# Altium footprint library Sockets.PcbLib: 80 footprints (part 3 of 6) (continued)
## DIPS28-600_a [mm] "DIP Socket 28 Leads, Row Spacing 15.24mm; Pitch 2.54mm" (continued)
3D body "DIPS28-600.stp": height 4.2, standoff -3.17, extent -8.85,-17.78 8.85,17.78

## DIPS32-600 [mm] "DIP Socket 32 Leads, Row Spacing 15.24mm; Pitch 2.54mm"
height 4.2
pads (32):
  rect 1.5x1.5 hole 0.9: 1(-7.62,19.05)
  round 1.5 hole 0.9: 2(-7.62,16.51) 3(-7.62,13.97) 4(-7.62,11.43) 5(-7.62,8.89) 6(-7.62,6.35) 7(-7.62,3.81) 8(-7.62,1.27) 9(-7.62,-1.27) 10(-7.62,-3.81) 11(-7.62,-6.35) 12(-7.62,-8.89) 13(-7.62,-11.43) 14(-7.62,-13.97) 15(-7.62,-16.51) 16(-7.62,-19.05) 17(7.62,-19.05) 18(7.62,-16.51) 19(7.62,-13.97) 20(7.62,-11.43) 21(7.62,-8.89) 22(7.62,-6.35) 23(7.62,-3.81) 24(7.62,-1.27) 25(7.62,1.27) 26(7.62,3.81) 27(7.62,6.35) 28(7.62,8.89) 29(7.62,11.43) 30(7.62,13.97) 31(7.62,16.51) 32(7.62,19.05)
Top Overlay:
  lines w0.2: -5.14,-1.45 5.36,-1.45 ; -5.14,1.45 5.36,1.45 ; -5.14,17.42 5.36,17.42 ; -5.14,20.32 -5.14,-17.42 5.36,-17.42 5.36,20.32 ; -8.85,-20.32 8.85,-20.32 8.85,20.32 -1.23,20.32 cw(c-2.43,20.32) -3.63,20.32 -8.85,20.32 -8.85,-20.32
Mechanical 8:
  lines w0.1: -8.12,-19.05 -7.62,-19.05 ; -8.12,-16.51 -7.62,-16.51 ; -8.12,-8.89 -7.62,-8.89 ; -8.12,-6.35 -7.62,-6.35 ; -8.12,-3.81 -7.62,-3.81 ; -8.12,-1.27 -7.62,-1.27 ; -8.12,1.27 -7.62,1.27 ; -8.12,3.81 -7.62,3.81 ; -8.12,6.35 -7.62,6.35 ; -8.12,8.89 -7.62,8.89 ; -8.12,11.43 -7.62,11.43 ; -8.12,13.97 -7.62,13.97 ; -8.12,16.51 -7.62,16.51 ; -8.12,19.05 -7.62,19.05 ; -7.62,-19.55 -7.62,-19.05 ; -7.62,-18.55 -7.62,-19.05 ; -7.62,-17.01 -7.62,-16.51 ; -7.62,-16.01 -7.62,-16.51 ; -7.62,-9.39 -7.62,-8.89 ; -7.62,-8.39 -7.62,-8.89 ; -7.62,-6.85 -7.62,-6.35 ; -7.62,-5.85 -7.62,-6.35 ; -7.62,-4.31 -7.62,-3.81 ; -7.62,-3.31 -7.62,-3.81 ; -7.62,-1.77 -7.62,-1.27 ; -7.62,-0.77 -7.62,-1.27 ; -7.62,0.77 -7.62,1.27 ; -7.62,1.77 -7.62,1.27 ; -7.62,3.31 -7.62,3.81 ; -7.62,4.31 -7.62,3.81 ; -7.62,5.85 -7.62,6.35 ; -7.62,6.85 -7.62,6.35 ; -7.62,8.39 -7.62,8.89 ; -7.62,9.39 -7.62,8.89 ; -7.62,10.93 -7.62,11.43 ; -7.62,11.93 -7.62,11.43 ; -7.62,13.47 -7.62,13.97 ; -7.62,14.47 -7.62,13.97 ; -7.62,16.01 -7.62,16.51 ; -7.62,17.01 -7.62,16.51 ; -7.62,18.55 -7.62,19.05 ; -7.62,19.55 -7.62,19.05 ; -7.12,-19.05 -7.62,-19.05 ; -7.12,-16.51 -7.62,-16.51 ; -7.12,-8.89 -7.62,-8.89 ; -7.12,-6.35 -7.62,-6.35 ; -7.12,-3.81 -7.62,-3.81 ; -7.12,-1.27 -7.62,-1.27 ; -7.12,1.27 -7.62,1.27 ; -7.12,3.81 -7.62,3.81 ; -7.12,6.35 -7.62,6.35 ; -7.12,8.89 -7.62,8.89 ; -7.12,11.43 -7.62,11.43 ; -7.12,13.97 -7.62,13.97 ; -7.12,16.51 -7.62,16.51 ; -7.12,19.05 -7.62,19.05 ; -0.5,0 0,0 ; 0,-0.5 0,0 ; 0,0.5 0,0 ; 0.5,0 0,0 ; 7.12,-19.05 7.62,-19.05 ; 7.12,-16.51 7.62,-16.51 ; 7.12,-13.97 7.62,-13.97 ; 7.12,-11.43 7.62,-11.43 ; 7.12,-8.89 7.62,-8.89 ; 7.12,-6.35 7.62,-6.35 ; 7.12,-3.81 7.62,-3.81 ; 7.12,-1.27 7.62,-1.27 ; 7.12,1.27 7.62,1.27 ; 7.12,3.81 7.62,3.81 ; 7.12,6.35 7.62,6.35 ; 7.12,8.89 7.62,8.89 ; 7.12,11.43 7.62,11.43 ; 7.12,13.97 7.62,13.97 ; 7.12,16.51 7.62,16.51 ; 7.12,19.05 7.62,19.05 ; 7.62,-19.55 7.62,-19.05 ; 7.62,-18.55 7.62,-19.05 ; 7.62,-17.01 7.62,-16.51 ; 7.62,-16.01 7.62,-16.51 ; 7.62,-14.47 7.62,-13.97 ; 7.62,-13.47 7.62,-13.97 ; 7.62,-11.93 7.62,-11.43 ; 7.62,-10.93 7.62,-11.43 ; 7.62,-9.39 7.62,-8.89 ; 7.62,-8.39 7.62,-8.89 ; 7.62,-6.85 7.62,-6.35 ; 7.62,-5.85 7.62,-6.35 ; 7.62,-4.31 7.62,-3.81 ; 7.62,-3.31 7.62,-3.81 ; 7.62,-1.77 7.62,-1.27 ; 7.62,-0.77 7.62,-1.27 ; 7.62,0.77 7.62,1.27 ; 7.62,1.77 7.62,1.27 ; 7.62,3.31 7.62,3.81 ; 7.62,4.31 7.62,3.81 ; 7.62,5.85 7.62,6.35 ; 7.62,6.85 7.62,6.35 ; 7.62,8.39 7.62,8.89 ; 7.62,9.39 7.62,8.89 ; 7.62,10.93 7.62,11.43 ; 7.62,11.93 7.62,11.43 ; 7.62,13.47 7.62,13.97 ; 7.62,14.47 7.62,13.97 ; 7.62,16.01 7.62,16.51 ; 7.62,17.01 7.62,16.51 ; 7.62,18.55 7.62,19.05 ; 7.62,19.55 7.62,19.05 ; 8.12,-19.05 7.62,-19.05 ; 8.12,-16.51 7.62,-16.51 ; 8.12,-13.97 7.62,-13.97 ; 8.12,-11.43 7.62,-11.43 ; 8.12,-8.89 7.62,-8.89 ; 8.12,-6.35 7.62,-6.35 ; 8.12,-3.81 7.62,-3.81 ; 8.12,-1.27 7.62,-1.27 ; 8.12,1.27 7.62,1.27 ; 8.12,3.81 7.62,3.81 ; 8.12,6.35 7.62,6.35 ; 8.12,8.89 7.62,8.89 ; 8.12,11.43 7.62,11.43 ; 8.12,13.97 7.62,13.97 ; 8.12,16.51 7.62,16.51 ; 8.12,19.05 7.62,19.05
Mechanical 14:
  lines w0.1: -5.14,-1.45 5.36,-1.45 ; -5.14,1.45 5.36,1.45 ; -5.14,17.42 5.36,17.42 ; -5.14,20.32 -5.14,-17.42 5.36,-17.42 5.36,20.32 ; -8.85,-20.32 8.85,-20.32 8.85,20.32 -1.23,20.32 cw(c-2.43,20.32) -3.63,20.32 -8.85,20.32 -8.85,-20.32
3D body "DIPS32-600.stp": height 4.2, standoff -3.17, extent -8.85,-20.32 8.85,20.32

## DIPS32-600_a [mm] "DIP Socket 32 Leads, Row Spacing 15.24mm; Pitch 2.54mm"
height 4.2
Top Overlay:
  lines w0.2: -5.14,-1.45 5.36,-1.45 ; -5.14,1.45 5.36,1.45 ; -5.14,17.42 5.36,17.42 ; -5.14,20.32 -5.14,-17.42 5.36,-17.42 5.36,20.32 ; -8.85,-20.32 8.85,-20.32 8.85,20.32 -1.23,20.32 cw(c-2.43,20.32) -3.63,20.32 -8.85,20.32 -8.85,-20.32
Mechanical 8:
  lines w0.1: -8.12,-19.05 -7.62,-19.05 ; -8.12,-16.51 -7.62,-16.51 ; -8.12,-8.89 -7.62,-8.89 ; -8.12,-6.35 -7.62,-6.35 ; -8.12,-3.81 -7.62,-3.81 ; -8.12,-1.27 -7.62,-1.27 ; -8.12,1.27 -7.62,1.27 ; -8.12,3.81 -7.62,3.81 ; -8.12,6.35 -7.62,6.35 ; -8.12,8.89 -7.62,8.89 ; -8.12,11.43 -7.62,11.43 ; -8.12,13.97 -7.62,13.97 ; -8.12,16.51 -7.62,16.51 ; -8.12,19.05 -7.62,19.05 ; -7.62,-19.55 -7.62,-19.05 ; -7.62,-18.55 -7.62,-19.05 ; -7.62,-17.01 -7.62,-16.51 ; -7.62,-16.01 -7.62,-16.51 ; -7.62,-9.39 -7.62,-8.89 ; -7.62,-8.39 -7.62,-8.89 ; -7.62,-6.85 -7.62,-6.35 ; -7.62,-5.85 -7.62,-6.35 ; -7.62,-4.31 -7.62,-3.81 ; -7.62,-3.31 -7.62,-3.81 ; -7.62,-1.77 -7.62,-1.27 ; -7.62,-0.77 -7.62,-1.27 ; -7.62,0.77 -7.62,1.27 ; -7.62,1.77 -7.62,1.27 ; -7.62,3.31 -7.62,3.81 ; -7.62,4.31 -7.62,3.81 ; -7.62,5.85 -7.62,6.35 ; -7.62,6.85 -7.62,6.35 ; -7.62,8.39 -7.62,8.89 ; -7.62,9.39 -7.62,8.89 ; -7.62,10.93 -7.62,11.43 ; -7.62,11.93 -7.62,11.43 ; -7.62,13.47 -7.62,13.97 ; -7.62,14.47 -7.62,13.97 ; -7.62,16.01 -7.62,16.51 ; -7.62,17.01 -7.62,16.51 ; -7.62,18.55 -7.62,19.05 ; -7.62,19.55 -7.62,19.05 ; -7.12,-19.05 -7.62,-19.05 ; -7.12,-16.51 -7.62,-16.51 ; -7.12,-8.89 -7.62,-8.89 ; -7.12,-6.35 -7.62,-6.35 ; -7.12,-3.81 -7.62,-3.81 ; -7.12,-1.27 -7.62,-1.27 ; -7.12,1.27 -7.62,1.27 ; -7.12,3.81 -7.62,3.81 ; -7.12,6.35 -7.62,6.35 ; -7.12,8.89 -7.62,8.89 ; -7.12,11.43 -7.62,11.43 ; -7.12,13.97 -7.62,13.97 ; -7.12,16.51 -7.62,16.51 ; -7.12,19.05 -7.62,19.05 ; -0.5,0 0,0 ; 0,-0.5 0,0 ; 0,0.5 0,0 ; 0.5,0 0,0 ; 7.12,-19.05 7.62,-19.05 ; 7.12,-16.51 7.62,-16.51 ; 7.12,-13.97 7.62,-13.97 ; 7.12,-11.43 7.62,-11.43 ; 7.12,-8.89 7.62,-8.89 ; 7.12,-6.35 7.62,-6.35 ; 7.12,-3.81 7.62,-3.81 ; 7.12,-1.27 7.62,-1.27 ; 7.12,1.27 7.62,1.27 ; 7.12,3.81 7.62,3.81 ; 7.12,6.35 7.62,6.35 ; 7.12,8.89 7.62,8.89 ; 7.12,11.43 7.62,11.43 ; 7.12,13.97 7.62,13.97 ; 7.12,16.51 7.62,16.51 ; 7.12,19.05 7.62,19.05 ; 7.62,-19.55 7.62,-19.05 ; 7.62,-18.55 7.62,-19.05 ; 7.62,-17.01 7.62,-16.51 ; 7.62,-16.01 7.62,-16.51 ; 7.62,-14.47 7.62,-13.97 ; 7.62,-13.47 7.62,-13.97 ; 7.62,-11.93 7.62,-11.43 ; 7.62,-10.93 7.62,-11.43 ; 7.62,-9.39 7.62,-8.89 ; 7.62,-8.39 7.62,-8.89 ; 7.62,-6.85 7.62,-6.35 ; 7.62,-5.85 7.62,-6.35 ; 7.62,-4.31 7.62,-3.81 ; 7.62,-3.31 7.62,-3.81 ; 7.62,-1.77 7.62,-1.27 ; 7.62,-0.77 7.62,-1.27 ; 7.62,0.77 7.62,1.27 ; 7.62,1.77 7.62,1.27 ; 7.62,3.31 7.62,3.81 ; 7.62,4.31 7.62,3.81 ; 7.62,5.85 7.62,6.35 ; 7.62,6.85 7.62,6.35 ; 7.62,8.39 7.62,8.89 ; 7.62,9.39 7.62,8.89 ; 7.62,10.93 7.62,11.43 ; 7.62,11.93 7.62,11.43 ; 7.62,13.47 7.62,13.97 ; 7.62,14.47 7.62,13.97 ; 7.62,16.01 7.62,16.51 ; 7.62,17.01 7.62,16.51 ; 7.62,18.55 7.62,19.05 ; 7.62,19.55 7.62,19.05 ; 8.12,-19.05 7.62,-19.05 ; 8.12,-16.51 7.62,-16.51 ; 8.12,-13.97 7.62,-13.97 ; 8.12,-11.43 7.62,-11.43 ; 8.12,-8.89 7.62,-8.89 ; 8.12,-6.35 7.62,-6.35 ; 8.12,-3.81 7.62,-3.81 ; 8.12,-1.27 7.62,-1.27 ; 8.12,1.27 7.62,1.27 ; 8.12,3.81 7.62,3.81 ; 8.12,6.35 7.62,6.35 ; 8.12,8.89 7.62,8.89 ; 8.12,11.43 7.62,11.43 ; 8.12,13.97 7.62,13.97 ; 8.12,16.51 7.62,16.51 ; 8.12,19.05 7.62,19.05
Mechanical 14:
  lines w0.1: -5.14,-1.45 5.36,-1.45 ; -5.14,1.45 5.36,1.45 ; -5.14,17.42 5.36,17.42 ; -5.14,20.32 -5.14,-17.42 5.36,-17.42 5.36,20.32 ; -8.85,-20.32 8.85,-20.32 8.85,20.32 -1.23,20.32 cw(c-2.43,20.32) -3.63,20.32 -8.85,20.32 -8.85,-20.32
3D body "DIPS32-600.stp": height 4.2, standoff -3.17, extent -8.85,-20.32 8.85,20.32

## DIPS40-600 [mm] "DIP Socket 40 Leads, Row Spacing 15.24mm; Pitch 2.54mm"
height 4.2
pads (40):
  rect 1.5x1.5 hole 0.9: 1(-7.62,24.13)
  round 1.5 hole 0.9: 2(-7.62,21.59) 3(-7.62,19.05) 4(-7.62,16.51) 5(-7.62,13.97) 6(-7.62,11.43) 7(-7.62,8.89) 8(-7.62,6.35) 9(-7.62,3.81) 10(-7.62,1.27) 11(-7.62,-1.27) 12(-7.62,-3.81) 13(-7.62,-6.35) 14(-7.62,-8.89) 15(-7.62,-11.43) 16(-7.62,-13.97) 17(-7.62,-16.51) 18(-7.62,-19.05) 19(-7.62,-21.59) 20(-7.62,-24.13) 21(7.62,-24.13) 22(7.62,-21.59) 23(7.62,-19.05) 24(7.62,-16.51) 25(7.62,-13.97) 26(7.62,-11.43) 27(7.62,-8.89) 28(7.62,-6.35) 29(7.62,-3.81) 30(7.62,-1.27) 31(7.62,1.27) 32(7.62,3.81) 33(7.62,6.35) 34(7.62,8.89) 35(7.62,11.43) 36(7.62,13.97) 37(7.62,16.51) 38(7.62,19.05) 39(7.62,21.59) 40(7.62,24.13)
Top Overlay:
  lines w0.2: -5.14,-25.4 -5.14,25.4 ; -5.14,-22.5 5.36,-22.5 ; -5.14,-9.07 5.36,-9.07 ; -5.14,-6.17 5.36,-6.17 ; -5.14,7.26 5.36,7.26 ; -5.14,10.16 5.36,10.16 ; -5.14,22.5 5.36,22.5 ; 5.36,-25.4 5.36,25.4 ; -8.85,-25.4 -8.85,25.4 -3.85,25.4 ccw(c-2.65,25.4) -1.45,25.4 8.85,25.4 8.85,-25.4 -8.85,-25.4
Mechanical 8:
  drawing of 164 lines, arcs and shapes, not listed
Mechanical 14:
  lines w0.1: -5.14,-25.4 -5.14,25.4 ; -5.14,-22.5 5.36,-22.5 ; -5.14,-9.07 5.36,-9.07 ; -5.14,-6.17 5.36,-6.17 ; -5.14,7.26 5.36,7.26 ; -5.14,10.16 5.36,10.16 ; -5.14,22.5 5.36,22.5 ; 5.36,-25.4 5.36,25.4 ; -8.85,-25.4 -8.85,25.4 -3.85,25.4 ccw(c-2.65,25.4) -1.45,25.4 8.85,25.4 8.85,-25.4 -8.85,-25.4
3D body "DIPS40-600.stp": height 4.2, standoff -3.17, extent -8.85,-25.4 8.85,25.4

## DIPS40-600_a [mm] "DIP Socket 40 Leads, Row Spacing 15.24mm; Pitch 2.54mm"
height 4.2
Top Overlay:
  lines w0.2: -5.14,-25.4 -5.14,25.4 ; -5.14,-22.5 5.36,-22.5 ; -5.14,-9.07 5.36,-9.07 ; -5.14,-6.17 5.36,-6.17 ; -5.14,7.26 5.36,7.26 ; -5.14,10.16 5.36,10.16 ; -5.14,22.5 5.36,22.5 ; 5.36,-25.4 5.36,25.4 ; -8.85,-25.4 -8.85,25.4 -3.85,25.4 ccw(c-2.65,25.4) -1.45,25.4 8.85,25.4 8.85,-25.4 -8.85,-25.4
Mechanical 8:
  drawing of 164 lines, arcs and shapes, not listed
Mechanical 14:
  lines w0.1: -5.14,-25.4 -5.14,25.4 ; -5.14,-22.5 5.36,-22.5 ; -5.14,-9.07 5.36,-9.07 ; -5.14,-6.17 5.36,-6.17 ; -5.14,7.26 5.36,7.26 ; -5.14,10.16 5.36,10.16 ; -5.14,22.5 5.36,22.5 ; 5.36,-25.4 5.36,25.4 ; -8.85,-25.4 -8.85,25.4 -3.85,25.4 ccw(c-2.65,25.4) -1.45,25.4 8.85,25.4 8.85,-25.4 -8.85,-25.4
3D body "DIPS40-600.stp": height 4.2, standoff -3.17, extent -8.85,-25.4 8.85,25.4

## DONGXIN_GZC9-Y [mm] "9 Pin Ceramic PCB Tube Socket"
height 17.8
pads (9):
  rrect50% 2.5x2.5 hole 1.8 rot 36: 1(-5.878,8.09)
  round 2.5 hole 1.8: 2(-9.511,3.09) 3(-9.511,-3.09) 4(-5.878,-8.09) 5(0,-10) 6(5.878,-8.09) 7(9.511,-3.09) 8(9.511,3.09) 9(5.878,8.09)
Top Overlay:
  circle w0.2: c0,0 r3.55
  circle w0.2: c0,0 r3.15
  circle w0.2: c-3.527,-4.854 r0.65
  circle w0.2: c0,-6 r0.65
  circle w0.2: c3.527,-4.854 r0.65
  circle w0.2: c5.706,-1.854 r0.65
  circle w0.2: c5.706,1.854 r0.65
  circle w0.2: c-3.527,4.854 r0.65
  circle w0.2: c-5.706,1.854 r0.65
  circle w0.2: c-5.706,-1.854 r0.65
  circle w0.2: c3.527,4.854 r0.65
  circle w0.2: c0,0 r7.009
  circle w0.2: c0,0 r4.992
  circle w0.2: c0,0 r3.55
  circle w0.2: c0,0 r3.15
  lines w0.2: -12.133,-3.399 ccw(c-15.8,0) -12.133,3.399 cw(c0,0) 12.133,3.399 ccw(c15.8,0) 12.133,-3.399 cw(c0,0) -12.133,-3.399
Mechanical 8:
  lines w0.1: -9.986,-3.245 -9.511,-3.09 ; -9.986,3.245 -9.511,3.09 ; -9.665,-2.615 -9.511,-3.09 ; -9.665,2.615 -9.511,3.09 ; -9.356,-3.566 -9.511,-3.09 ; -9.356,3.566 -9.511,3.09 ; -9.035,-2.936 -9.511,-3.09 ; -9.035,2.936 -9.511,3.09 ; -6.282,-7.796 -5.878,-8.09 ; -6.282,7.796 -5.878,8.09 ; -6.172,-8.495 -5.878,-8.09 ; -6.172,8.495 -5.878,8.09 ; -5.584,-7.686 -5.878,-8.09 ; -5.584,7.686 -5.878,8.09 ; -5.473,-8.384 -5.878,-8.09 ; -5.473,8.384 -5.878,8.09 ; 5.473,-8.384 5.878,-8.09 ; 5.473,8.384 5.878,8.09 ; 5.584,-7.686 5.878,-8.09 ; 5.584,7.686 5.878,8.09 ; 6.172,-8.495 5.878,-8.09 ; 6.172,8.495 5.878,8.09 ; 6.282,-7.796 5.878,-8.09 ; 6.282,7.796 5.878,8.09 ; 9.035,-2.936 9.511,-3.09 ; 9.035,2.936 9.511,3.09 ; 9.356,-3.566 9.511,-3.09 ; 9.356,3.566 9.511,3.09 ; 9.665,-2.615 9.511,-3.09 ; 9.665,2.615 9.511,3.09 ; 9.986,-3.245 9.511,-3.09 ; 9.986,3.245 9.511,3.09 ; 0,-10 0,-9.5 0,-10 ; 0,-10 0.5,-10 0,-10 ; 0,-10 0,-10.5 0,-10 ; 0,-10 -0.5,-10 0,-10 ; 0,0 0,0.5 0,0 ; 0,0 0.5,0 0,0 ; 0,0 0,-0.5 0,0 ; 0,0 -0.5,0 0,0
Mechanical 14:
  circle w0.1: c0,0 r10.4
  circle w0.1: c0,0 r10.8
  lines w0.1: -12.133,-3.399 ccw(c-15.8,0) -12.133,3.399 cw(c0,0) 12.133,3.399 ccw(c15.8,0) 12.133,-3.399 cw(c0,0) -12.133,-3.399
3D body "DONGXIN_GZC9-Y.stp": height 14, standoff -3.8, extent -12.133,-12.6 12.133,12.6

## E-TEC_BPQ400-0830-20AA95 [mm] "400 Pins, Pitch 0.8mm, Matrix 20x20, BGA Quick Lock Socket"
height 24.2
pads (402):
  round 0.5 hole 1.1 unplated: 1(-15.6,4) 2(15.6,-4)
  round 0.4 smd: A1(-7.6,7.6) A2(-6.8,7.6) A3(-6,7.6) A4(-5.2,7.6) A5(-4.4,7.6) A6(-3.6,7.6) A7(-2.8,7.6) A8(-2,7.6) A9(-1.2,7.6) A10(-0.4,7.6) A11(0.4,7.6) A12(1.2,7.6) A13(2,7.6) A14(2.8,7.6) A15(3.6,7.6) A16(4.4,7.6) A17(5.2,7.6) A18(6,7.6) A19(6.8,7.6) A20(7.6,7.6) B1(-7.6,6.8) B2(-6.8,6.8) B3(-6,6.8) B4(-5.2,6.8) B5(-4.4,6.8) B6(-3.6,6.8) B7(-2.8,6.8) B8(-2,6.8) B9(-1.2,6.8) B10(-0.4,6.8) B11(0.4,6.8) B12(1.2,6.8) B13(2,6.8) B14(2.8,6.8) B15(3.6,6.8) B16(4.4,6.8) B17(5.2,6.8) B18(6,6.8) B19(6.8,6.8) B20(7.6,6.8) C1(-7.6,6) C2(-6.8,6) C3(-6,6) C4(-5.2,6) C5(-4.4,6) C6(-3.6,6) C7(-2.8,6) C8(-2,6) C9(-1.2,6) C10(-0.4,6) C11(0.4,6) C12(1.2,6) C13(2,6) C14(2.8,6) C15(3.6,6) C16(4.4,6) C17(5.2,6) C18(6,6) C19(6.8,6) C20(7.6,6) D1(-7.6,5.2) D2(-6.8,5.2) D3(-6,5.2) D4(-5.2,5.2) D5(-4.4,5.2) D6(-3.6,5.2) D7(-2.8,5.2) D8(-2,5.2) D9(-1.2,5.2) D10(-0.4,5.2) D11(0.4,5.2) D12(1.2,5.2) D13(2,5.2) D14(2.8,5.2) D15(3.6,5.2) D16(4.4,5.2) D17(5.2,5.2) D18(6,5.2) D19(6.8,5.2) D20(7.6,5.2) E1(-7.6,4.4) E2(-6.8,4.4) E3(-6,4.4) E4(-5.2,4.4) E5(-4.4,4.4) E6(-3.6,4.4) E7(-2.8,4.4) E8(-2,4.4) E9(-1.2,4.4) E10(-0.4,4.4) E11(0.4,4.4) E12(1.2,4.4) E13(2,4.4) E14(2.8,4.4) E15(3.6,4.4) E16(4.4,4.4) E17(5.2,4.4) E18(6,4.4) E19(6.8,4.4) E20(7.6,4.4) F1(-7.6,3.6) F2(-6.8,3.6) F3(-6,3.6) F4(-5.2,3.6) F5(-4.4,3.6) F6(-3.6,3.6) F7(-2.8,3.6) F8(-2,3.6) F9(-1.2,3.6) F10(-0.4,3.6) F11(0.4,3.6) F12(1.2,3.6) F13(2,3.6) F14(2.8,3.6) F15(3.6,3.6) F16(4.4,3.6) F17(5.2,3.6) F18(6,3.6) F19(6.8,3.6) F20(7.6,3.6) G1(-7.6,2.8) G2(-6.8,2.8) G3(-6,2.8) G4(-5.2,2.8) G5(-4.4,2.8) G6(-3.6,2.8) G7(-2.8,2.8) G8(-2,2.8) G9(-1.2,2.8) G10(-0.4,2.8) G11(0.4,2.8) G12(1.2,2.8) G13(2,2.8) G14(2.8,2.8) G15(3.6,2.8) G16(4.4,2.8) G17(5.2,2.8) G18(6,2.8) G19(6.8,2.8) G20(7.6,2.8) H1(-7.6,2) H2(-6.8,2) H3(-6,2) H4(-5.2,2) H5(-4.4,2) H6(-3.6,2) H7(-2.8,2) H8(-2,2) H9(-1.2,2) H10(-0.4,2) H11(0.4,2) H12(1.2,2) H13(2,2) H14(2.8,2) H15(3.6,2) H16(4.4,2) H17(5.2,2) H18(6,2) H19(6.8,2) H20(7.6,2) J1(-7.6,1.2) J2(-6.8,1.2) J3(-6,1.2) J4(-5.2,1.2) J5(-4.4,1.2) J6(-3.6,1.2) J7(-2.8,1.2) J8(-2,1.2) J9(-1.2,1.2) J10(-0.4,1.2) J11(0.4,1.2) J12(1.2,1.2) J13(2,1.2) J14(2.8,1.2) J15(3.6,1.2) J16(4.4,1.2) J17(5.2,1.2) J18(6,1.2) J19(6.8,1.2) J20(7.6,1.2) K1(-7.6,0.4) K2(-6.8,0.4) K3(-6,0.4) K4(-5.2,0.4) K5(-4.4,0.4) K6(-3.6,0.4) K7(-2.8,0.4) K8(-2,0.4) K9(-1.2,0.4) K10(-0.4,0.4) K11(0.4,0.4) K12(1.2,0.4) K13(2,0.4) K14(2.8,0.4) K15(3.6,0.4) K16(4.4,0.4) K17(5.2,0.4) K18(6,0.4) K19(6.8,0.4) K20(7.6,0.4) L1(-7.6,-0.4) L2(-6.8,-0.4) L3(-6,-0.4) L4(-5.2,-0.4) L5(-4.4,-0.4) L6(-3.6,-0.4) L7(-2.8,-0.4) L8(-2,-0.4) L9(-1.2,-0.4) L10(-0.4,-0.4) L11(0.4,-0.4) L12(1.2,-0.4) L13(2,-0.4) L14(2.8,-0.4) L15(3.6,-0.4) L16(4.4,-0.4) L17(5.2,-0.4) L18(6,-0.4) L19(6.8,-0.4) L20(7.6,-0.4) M1(-7.6,-1.2) M2(-6.8,-1.2) M3(-6,-1.2) M4(-5.2,-1.2) M5(-4.4,-1.2) M6(-3.6,-1.2) M7(-2.8,-1.2) M8(-2,-1.2) M9(-1.2,-1.2) M10(-0.4,-1.2) M11(0.4,-1.2) M12(1.2,-1.2) M13(2,-1.2) M14(2.8,-1.2) M15(3.6,-1.2) M16(4.4,-1.2) M17(5.2,-1.2) M18(6,-1.2) M19(6.8,-1.2) M20(7.6,-1.2) N1(-7.6,-2) N2(-6.8,-2) N3(-6,-2) N4(-5.2,-2) N5(-4.4,-2) N6(-3.6,-2) N7(-2.8,-2) N8(-2,-2) N9(-1.2,-2) N10(-0.4,-2) N11(0.4,-2) N12(1.2,-2) N13(2,-2) N14(2.8,-2) N15(3.6,-2) N16(4.4,-2) N17(5.2,-2) N18(6,-2) N19(6.8,-2) N20(7.6,-2) P1(-7.6,-2.8) P2(-6.8,-2.8) P3(-6,-2.8) P4(-5.2,-2.8) P5(-4.4,-2.8) P6(-3.6,-2.8) P7(-2.8,-2.8) P8(-2,-2.8) P9(-1.2,-2.8) P10(-0.4,-2.8) P11(0.4,-2.8) P12(1.2,-2.8) P13(2,-2.8) P14(2.8,-2.8) P15(3.6,-2.8) P16(4.4,-2.8) P17(5.2,-2.8) P18(6,-2.8) P19(6.8,-2.8) P20(7.6,-2.8) R1(-7.6,-3.6) R2(-6.8,-3.6) R3(-6,-3.6) R4(-5.2,-3.6) R5(-4.4,-3.6) R6(-3.6,-3.6) R7(-2.8,-3.6) R8(-2,-3.6) R9(-1.2,-3.6) R10(-0.4,-3.6) R11(0.4,-3.6) R12(1.2,-3.6) R13(2,-3.6) R14(2.8,-3.6) R15(3.6,-3.6) R16(4.4,-3.6) R17(5.2,-3.6) R18(6,-3.6) R19(6.8,-3.6) R20(7.6,-3.6) T1(-7.6,-4.4) T2(-6.8,-4.4) T3(-6,-4.4) T4(-5.2,-4.4) T5(-4.4,-4.4) T6(-3.6,-4.4) T7(-2.8,-4.4) T8(-2,-4.4) T9(-1.2,-4.4) T10(-0.4,-4.4) T11(0.4,-4.4) T12(1.2,-4.4) T13(2,-4.4) T14(2.8,-4.4) T15(3.6,-4.4) T16(4.4,-4.4) T17(5.2,-4.4) T18(6,-4.4) T19(6.8,-4.4) T20(7.6,-4.4) U1(-7.6,-5.2) U2(-6.8,-5.2) U3(-6,-5.2) U4(-5.2,-5.2) U5(-4.4,-5.2) U6(-3.6,-5.2) U7(-2.8,-5.2) U8(-2,-5.2) U9(-1.2,-5.2) U10(-0.4,-5.2) U11(0.4,-5.2) U12(1.2,-5.2) U13(2,-5.2) U14(2.8,-5.2) U15(3.6,-5.2) U16(4.4,-5.2) U17(5.2,-5.2) U18(6,-5.2) U19(6.8,-5.2) U20(7.6,-5.2) V1(-7.6,-6) V2(-6.8,-6) V3(-6,-6) V4(-5.2,-6) V5(-4.4,-6) V6(-3.6,-6) V7(-2.8,-6) V8(-2,-6) V9(-1.2,-6) V10(-0.4,-6) V11(0.4,-6) V12(1.2,-6) V13(2,-6) V14(2.8,-6) V15(3.6,-6) V16(4.4,-6) V17(5.2,-6) V18(6,-6) V19(6.8,-6) V20(7.6,-6) W1(-7.6,-6.8) W2(-6.8,-6.8) W3(-6,-6.8) W4(-5.2,-6.8) W5(-4.4,-6.8) W6(-3.6,-6.8) W7(-2.8,-6.8) W8(-2,-6.8) W9(-1.2,-6.8) W10(-0.4,-6.8) W11(0.4,-6.8) W12(1.2,-6.8) W13(2,-6.8) W14(2.8,-6.8) W15(3.6,-6.8) W16(4.4,-6.8) W17(5.2,-6.8) W18(6,-6.8) W19(6.8,-6.8) W20(7.6,-6.8) Y1(-7.6,-7.6) Y2(-6.8,-7.6) Y3(-6,-7.6) Y4(-5.2,-7.6) Y5(-4.4,-7.6) Y6(-3.6,-7.6) Y7(-2.8,-7.6) Y8(-2,-7.6) Y9(-1.2,-7.6) Y10(-0.4,-7.6) Y11(0.4,-7.6) Y12(1.2,-7.6) Y13(2,-7.6) Y14(2.8,-7.6) Y15(3.6,-7.6) Y16(4.4,-7.6) Y17(5.2,-7.6) Y18(6,-7.6) Y19(6.8,-7.6) Y20(7.6,-7.6)
Top Overlay:
  circle w0.25: c-9.1,7.6 r0.125
  lines w0.2: -25.5,-3 -8,-3 ; -25.5,3 -18.5,3 ; -19.5,-3 -19.5,-12.5 -20,-13 -25,-13 -25.5,-12.5 -25.5,12.5 -25,13 -20,13 -19.5,12.5 -19.5,3 ; -18.5,-3 -18.5,-17.5 ; -17.8,-3.1 -17.8,-17.21 ; -17.787,17.205 -17.8,3.1 -16.425,3.1 ; -16.425,3 -18.5,3 ; -15.025,3 -8,3 ; -15.025,3.1 -8,3.1 ; -7.5,-17.423 7.5,-17.423 ; -7.5,-16.5 7.5,-16.5 ; -7.5,-14.5 -7.5,-19.957 7.5,-19.957 7.5,-14.5 ; -7.5,14.5 -7.5,19.957 7.5,19.957 7.5,14.5 ; -7.5,16.5 7.5,16.5 ; -7.5,17.423 7.5,17.423 ; 8,-3.1 15.025,-3.1 ; 8,3.1 18.5,3.1 ; 16.425,-3.1 18.5,-3.1 ; 17.8,-3.1 17.8,-17.21 ; 17.8,3.1 17.8,17.21 ; -18.5,-17.5 -17.8,-17.21 ; -18.5,-17.5 -17.5,-18.5 ; -18.5,3 -18.5,17.5 ; -18.5,17.5 -17.8,17.21 -17.21,17.8 ; -18.5,17.5 -17.5,18.5 ; -17.8,-17.21 -17.21,-17.8 ; -17.5,-18.5 -17.21,-17.8 ; -17.5,-18.5 -7.7,-18.5 ; -17.5,18.5 -17.21,17.8 ; -17.5,18.5 -7.7,18.5 ; -17.21,-17.8 -8.4,-17.8 ; -17.21,17.8 -8.4,17.8 ; -8.4,-17.8 -7.7,-18.5 ; -8.4,-17.8 -8.4,-13.8 ; -8.4,-13.8 -7.7,-14.5 ; -8.4,-13.8 8.4,-13.8 ; -8.4,13.8 8.4,13.8 ; -8.4,13.8 -7.7,14.5 ; -8.4,13.8 -8.4,17.8 ; -8.4,17.8 -7.7,18.5 ; -7.7,-18.5 -7.7,-14.5 ; -7.7,-14.5 7.7,-14.5 ; -7.7,14.5 -7.7,18.5 ; -7.7,14.5 7.7,14.5 ; 7.7,-18.5 8.4,-17.8 ; 7.7,-18.5 17.5,-18.5 ; 7.7,-18.5 7.7,-14.5 ; 7.7,-14.5 8.4,-13.8 ; 7.7,14.5 8.4,13.8 ; 7.7,14.5 7.7,18.5 ; 7.7,18.5 8.4,17.8 ; 7.7,18.5 17.5,18.5 ; 8.4,-17.8 8.4,-13.8 ; 8.4,-17.8 17.21,-17.8 ; 8.4,13.8 8.4,17.8 ; 8.4,17.8 17.21,17.8 ; 17.21,-17.8 17.5,-18.5 ; 17.21,-17.8 17.8,-17.21 ; 17.21,17.8 17.8,17.21 ; 17.21,17.8 17.5,18.5 ; 17.5,-18.5 18.5,-17.5 ; 17.5,18.5 18.5,17.5 ; 17.8,-17.21 18.5,-17.5 ; 17.8,17.21 18.5,17.5 ; 18.5,-17.5 18.5,17.5 ; -18.5,-3.1 -8,-3.1 -18.5,-3.1
Mechanical 8:
  lines w0.1: -16.1,4 -15.6,4 ; -15.6,3.5 -15.6,4 ; -15.6,4.5 -15.6,4 ; -15.1,4 -15.6,4 ; -8.1,-7.6 -7.6,-7.6 ; -8.1,7.6 -7.6,7.6 ; -7.6,-8.1 -7.6,-7.6 ; -7.6,-7.1 -7.6,-7.6 ; -7.6,7.1 -7.6,7.6 ; -7.6,8.1 -7.6,7.6 ; -7.1,-7.6 -7.6,-7.6 ; -7.1,7.6 -7.6,7.6 ; -0.5,0 0,0 ; 0,-0.5 0,0 ; 0,0.5 0,0 ; 0.5,0 0,0 ; 7.1,-7.6 7.6,-7.6 ; 7.1,7.6 7.6,7.6 ; 7.6,-8.1 7.6,-7.6 ; 7.6,-7.1 7.6,-7.6 ; 7.6,7.1 7.6,7.6 ; 7.6,8.1 7.6,7.6 ; 8.1,-7.6 7.6,-7.6 ; 8.1,7.6 7.6,7.6 ; 15.1,-4 15.6,-4 ; 15.6,-4.5 15.6,-4 ; 15.6,-3.5 15.6,-4 ; 16.1,-4 15.6,-4
Mechanical 14:
  lines w0.1: -25.5,-3 3,-3 3,3 -25.5,3 ; -19.5,-3 -19.5,-12.5 -20,-13 -25,-13 -25.5,-12.5 -25.5,12.5 -25,13 -20,13 -19.5,12.5 -19.5,3 ; -18.5,-3 -18.5,-17.5 ; -18.5,3 -18.5,17.5 ; -17.8,-3.1 -17.8,-17.21 ; -17.8,3.1 -17.787,17.205 ; -7.5,-17.423 7.5,-17.423 ; -7.5,-16.5 7.5,-16.5 ; -7.5,-14.5 -7.5,-19.957 7.5,-19.957 7.5,-14.5 ; -7.5,14.5 -7.5,19.957 7.5,19.957 7.5,14.5 ; -7.5,16.5 7.5,16.5 ; -7.5,17.423 7.5,17.423 ; 17.8,-3.1 17.8,-17.21 ; 17.8,3.1 17.8,17.21 ; 18.5,-3.1 -18.5,-3.1 4.113,-3.1 ccw(c0.312,0) 4.113,3.1 -18.5,3.1 18.5,3.1 ; -18.5,-17.5 -17.8,-17.21 ; -18.5,-17.5 -17.5,-18.5 ; -18.5,17.5 -17.8,17.21 -17.21,17.8 ; -18.5,17.5 -17.5,18.5 ; -17.8,-17.21 -17.21,-17.8 ; -17.5,-18.5 -17.21,-17.8 ; -17.5,-18.5 -7.7,-18.5 ; -17.5,18.5 -17.21,17.8 ; -17.5,18.5 -7.7,18.5 ; -17.21,-17.8 -8.4,-17.8 ; -17.21,17.8 -8.4,17.8 ; -8.4,-17.8 -7.7,-18.5 ; -8.4,-17.8 -8.4,-13.8 ; -8.4,-13.8 -7.7,-14.5 ; -8.4,-13.8 8.4,-13.8 ; -8.4,13.8 8.4,13.8 ; -8.4,13.8 -7.7,14.5 ; -8.4,13.8 -8.4,17.8 ; -8.4,17.8 -7.7,18.5 ; -7.7,-18.5 -7.7,-14.5 ; -7.7,-14.5 7.7,-14.5 ; -7.7,14.5 -7.7,18.5 ; -7.7,14.5 7.7,14.5 ; 7.7,-18.5 8.4,-17.8 ; 7.7,-18.5 17.5,-18.5 ; 7.7,-18.5 7.7,-14.5 ; 7.7,-14.5 8.4,-13.8 ; 7.7,14.5 8.4,13.8 ; 7.7,14.5 7.7,18.5 ; 7.7,18.5 8.4,17.8 ; 7.7,18.5 17.5,18.5 ; 8.4,-17.8 8.4,-13.8 ; 8.4,-17.8 17.21,-17.8 ; 8.4,13.8 8.4,17.8 ; 8.4,17.8 17.21,17.8 ; 17.21,-17.8 17.5,-18.5 ; 17.21,-17.8 17.8,-17.21 ; 17.21,17.8 17.8,17.21 ; 17.21,17.8 17.5,18.5 ; 17.5,-18.5 18.5,-17.5 ; 17.5,18.5 18.5,17.5 ; 17.8,-17.21 18.5,-17.5 ; 17.8,17.21 18.5,17.5 ; 18.5,-17.5 18.5,17.5
  text "20" at 7.85,8.9 h0.6
  text "19" at 7.05,8.9 h0.6
  text "18" at 6.25,8.9 h0.6
  text "17" at 5.45,8.9 h0.6
  text "16" at 4.65,8.9 h0.6
  text "15" at 3.85,8.9 h0.6
  text "14" at 3.05,8.9 h0.6
  text "13" at 2.25,8.9 h0.6
  text "12" at 1.45,8.9 h0.6
  text "11" at 0.65,8.9 h0.6
  text "10" at -0.15,8.9 h0.6
  text "9" at -0.95,8.9 h0.6
  text "8" at -1.75,8.9 h0.6
  text "7" at -2.55,8.9 h0.6
  text "6" at -3.35,8.9 h0.6
  text "5" at -4.15,8.9 h0.6
  text "4" at -4.95,8.9 h0.6
  text "3" at -5.75,8.9 h0.6
  text "2" at -6.55,8.9 h0.6
  text "1" at -7.35,8.9 h0.6
  text "A" at -9.4,7.3 h0.6
  text "B" at -9.4,6.5 h0.6
  text "C" at -9.4,5.7 h0.6
  text "D" at -9.4,4.9 h0.6
  text "E" at -9.4,4.1 h0.6
  text "F" at -9.4,3.3 h0.6
  text "G" at -9.4,2.5 h0.6
  text "H" at -9.4,1.7 h0.6
  text "J" at -9.4,0.9 h0.6
  text "K" at -9.4,0.1 h0.6
  text "L" at -9.4,-0.7 h0.6
  text "M" at -9.4,-1.5 h0.6
  text "N" at -9.4,-2.3 h0.6
  text "P" at -9.4,-3.1 h0.6
  text "R" at -9.4,-3.9 h0.6
  text "T" at -9.4,-4.7 h0.6
  text "U" at -9.4,-5.5 h0.6
  text "V" at -9.4,-6.3 h0.6
  text "W" at -9.4,-7.1 h0.6
  text "Y" at -9.4,-7.9 h0.6
Mechanical 15:
  lines w0.05: -25.75,-20.207 18.75,-20.207 18.75,20.207 -25.75,20.207 -25.75,-20.207
  lines w0.1: -0.5,0 0,0 ; 0,-0.5 0,0 ; 0,0.5 0,0 ; 0.5,0 0,0
3D body "E-TEC_BPQ400-0830-20AA95.stp": height 25.2, standoff -1.6, extent -25.5,-19.976 18.5,19.976

## E-TEC_LEH-210-S900 [mm] "Horizontal DIP Socket 10 Leads, Row Spacing 5.08 mm; Pitch 2.54 mm"
height 7.62
pads (10):
  rect 1.5x1.5 hole 0.8: 1(-2.54,5.08)
  round 1.5 hole 0.8: 2(-2.54,2.54) 3(-2.54,0) 4(-2.54,-2.54) 5(-2.54,-5.08) 6(2.54,-5.08) 7(2.54,-2.54) 8(2.54,0) 9(2.54,2.54) 10(2.54,5.08)
Top Overlay:
  lines w0.2: -7.34,-5.98 -8.14,-5.98 -8.14,-4.18 -7.34,-4.18 ; -7.34,-3.44 -8.14,-3.44 -8.14,-1.64 -7.34,-1.64 ; -7.34,-0.9 -8.14,-0.9 -8.14,0.9 -7.34,0.9 ; -7.34,1.64 -8.14,1.64 -8.14,3.44 -7.34,3.44 ; -7.34,4.18 -8.14,4.18 -8.14,5.98 -7.34,5.98 ; -4.84,-5.73 -3.94,-5.73 -3.94,-4.43 -4.84,-4.43 ; -4.84,-3.19 -3.94,-3.19 -3.94,-1.89 -4.84,-1.89 ; -4.84,-0.65 -3.94,-0.65 -3.94,0.65 -4.84,0.65 ; -4.84,1.89 -3.94,1.89 -3.94,3.19 -4.84,3.19 ; -4.84,4.43 -3.94,4.43 -3.94,5.73 -4.84,5.73 ; -3.94,-5.48 -3.618,-5.48 ; -3.94,-4.68 -3.618,-4.68 ; -3.94,-2.94 -3.618,-2.94 ; -3.94,-2.14 -3.618,-2.14 ; -3.94,-0.4 -3.618,-0.4 ; -3.94,0.4 -3.618,0.4 ; -3.94,2.14 -3.618,2.14 ; -3.94,2.94 -3.618,2.94 ; -3.94,4.68 -3.618,4.68 ; -3.94,5.48 -3.618,5.48 ; -1.462,-5.48 1.462,-5.48 ; -1.462,-4.68 1.462,-4.68 ; -1.462,-2.94 1.462,-2.94 ; -1.462,-2.14 1.462,-2.14 ; -1.462,-0.4 1.462,-0.4 ; -1.462,0.4 1.462,0.4 ; -1.462,2.14 1.462,2.14 ; -1.462,2.94 1.462,2.94 ; -1.462,4.68 1.462,4.68 1.462,5.48 -1.462,5.48 ; -7.34,-6.3 -7.34,6.3 -4.84,6.3 -4.84,-6.3 -7.34,-6.3
Mechanical 8:
  lines w0.1: -3.04,-5.08 -2.54,-5.08 ; -3.04,-2.54 -2.54,-2.54 ; -3.04,0 -2.54,0 ; -3.04,2.54 -2.54,2.54 ; -3.04,5.08 -2.54,5.08 ; -2.54,-5.58 -2.54,-5.08 ; -2.54,-4.58 -2.54,-5.08 ; -2.54,-3.04 -2.54,-2.54 ; -2.54,-2.04 -2.54,-2.54 ; -2.54,-0.5 -2.54,0 ; -2.54,0.5 -2.54,0 ; -2.54,2.04 -2.54,2.54 ; -2.54,3.04 -2.54,2.54 ; -2.54,4.58 -2.54,5.08 ; -2.54,5.58 -2.54,5.08 ; -2.04,-5.08 -2.54,-5.08 ; -2.04,-2.54 -2.54,-2.54 ; -2.04,0 -2.54,0 ; -2.04,2.54 -2.54,2.54 ; -2.04,5.08 -2.54,5.08 ; -0.5,0 0,0 ; 0,-0.5 0,0 ; 0,0.5 0,0 ; 0.5,0 0,0 ; 2.04,-5.08 2.54,-5.08 ; 2.04,-2.54 2.54,-2.54 ; 2.04,0 2.54,0 ; 2.04,2.54 2.54,2.54 ; 2.04,5.08 2.54,5.08 ; 2.54,-5.58 2.54,-5.08 ; 2.54,-4.58 2.54,-5.08 ; 2.54,-3.04 2.54,-2.54 ; 2.54,-2.04 2.54,-2.54 ; 2.54,-0.5 2.54,0 ; 2.54,0.5 2.54,0 ; 2.54,2.04 2.54,2.54 ; 2.54,3.04 2.54,2.54 ; 2.54,4.58 2.54,5.08 ; 2.54,5.58 2.54,5.08 ; 3.04,-5.08 2.54,-5.08 ; 3.04,-2.54 2.54,-2.54 ; 3.04,0 2.54,0 ; 3.04,2.54 2.54,2.54 ; 3.04,5.08 2.54,5.08
3D body "E-TEC_LEH-210-S900.stp": height 7.62, standoff -2.8, extent -8.14,-6.3 2.94,6.3